# Altium footprint library heromap.PcbLib: 593 footprints (part 18 of 38)
Each footprint in its own frame and in the unit in brackets; x right, y up, seen from the top. Pads: shape width x height; smd on the part's side, far side on the other; paste and mask are expansions set on the pad; w line width, h text height; cw(c..) or ccw(c..) is an arc to the next point about the centre after c.
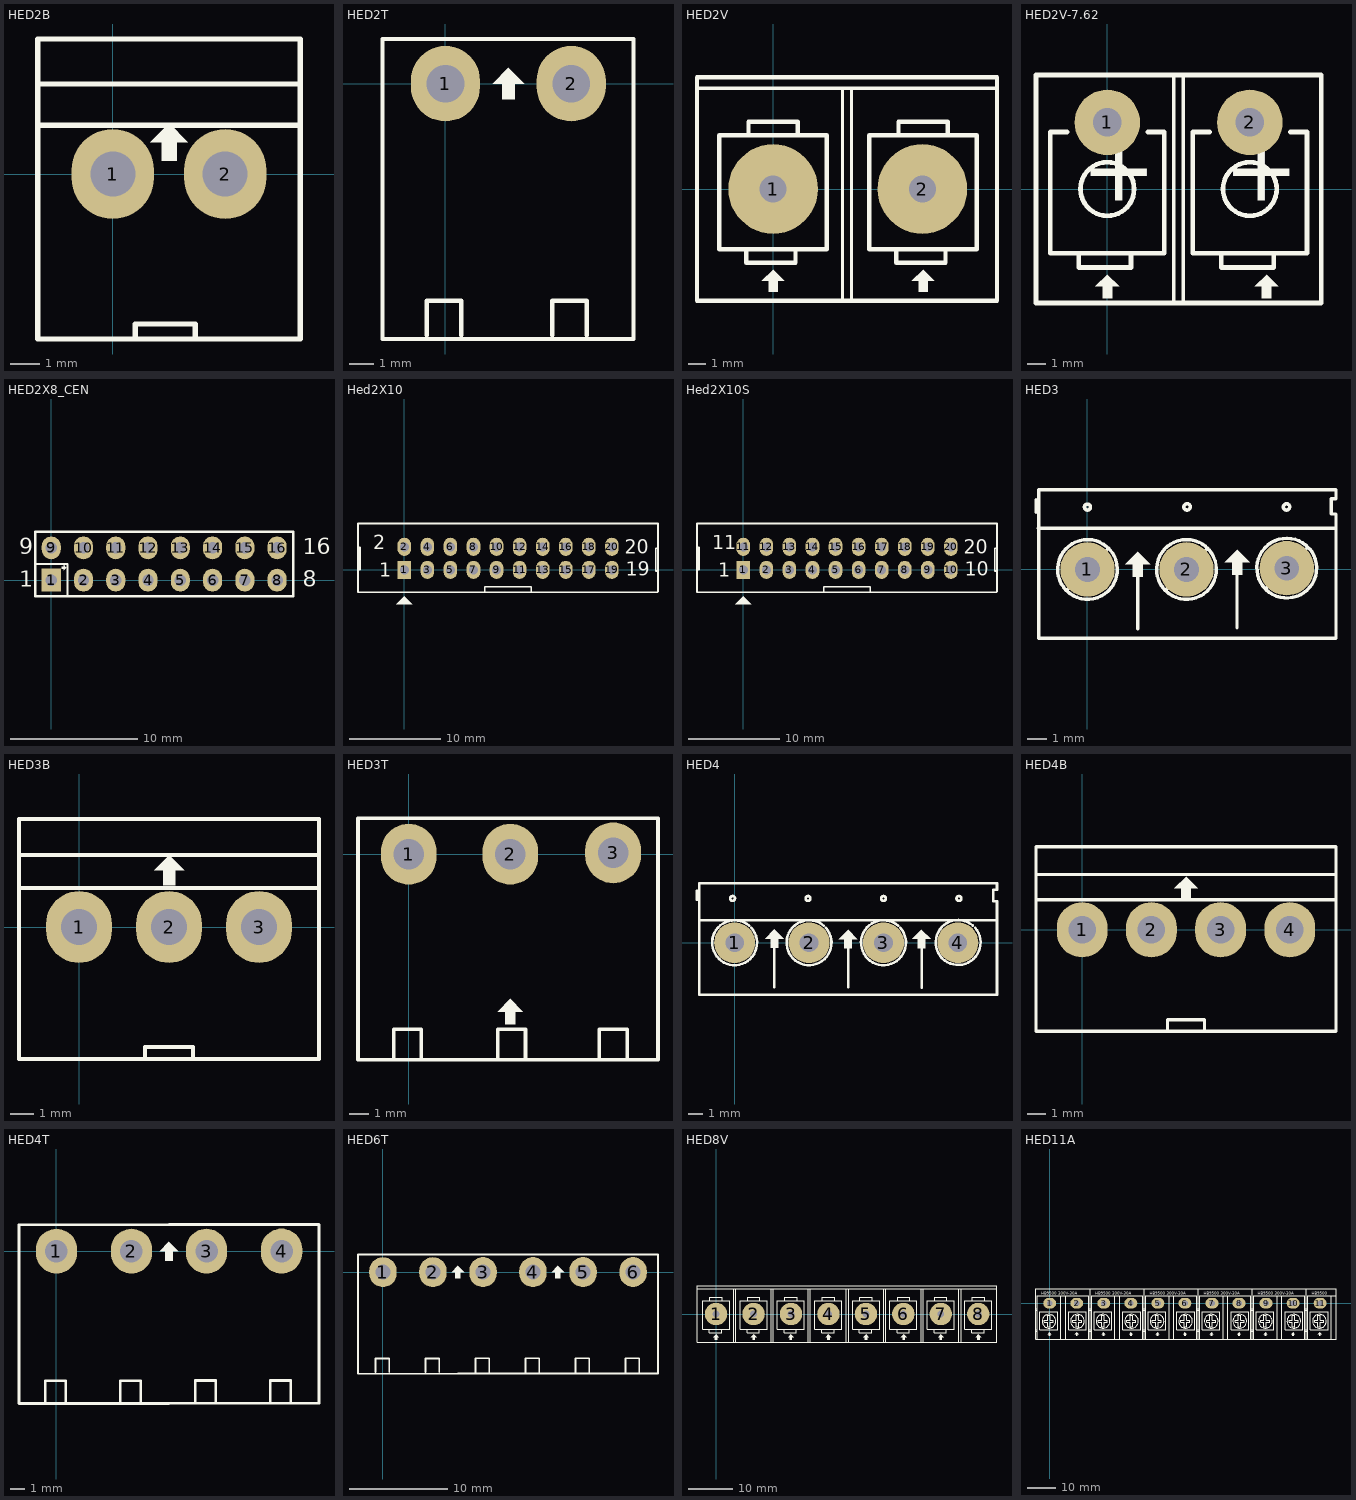
[diagram p17: the footprints below, top view; thin cyan lines are the x and y axes]

## HED2B [mil] "Header 2, 2 pin, hight 300mil, Pin to Pin 150, Colour White"
height 300
pads (2):
  oval 110x120 hole 60: 1(0,0) 2(150,0)
Top Overlay:
  region: 75,67.5 50,42.5 65,42.5 65,17.5 85,17.5 85,42.5 100,42.5
  lines w7: -100,65 250,65 ; -100,120 250,120 ; 30,-220 30,-200 110,-200 110,-220 ; -100,-220 -100,180 250,180 250,-220 -100,-220

## HED2T [mil] "Header 2, 2 pin, hight 300mil, Pin to Pin 200, Colour Green"
height 300
pads (2):
  oval 110x120 hole 60: 1(0,0) 2(200,0)
Top Overlay:
  region: 100,25 75,0 90,0 90,-25 110,-25 110,0 125,0
  lines w7: -30,-400 -30,-345 25,-345 25,-400 ; 170,-400 170,-345 225,-345 225,-400 ; -100,-406 299,-406 299,-15 299,15 299,71 -100,71 -100,-406
3D body "SW3dPS-5EHDR_2P.STEP": height 333.51, standoff -157.48, extent -100,-406.22 293.7,66.22

## HED2V [mil] "Header 6"
height 300
pads (2):
  round 200 hole 60: 1(0,0) 2(333.33,0)
Top Overlay:
  region: 335,-180 310,-205 325,-205 325,-230 345,-230 345,-205 360,-205
  region: 0,-180 -25,-205 -10,-205 -10,-230 10,-230 10,-205 25,-205
  lines w7: -170,225 499,225 ; 155,-250 155,225 ; 175,-250 175,225
  lines w10: -60,-135 -60,-165 50,-165 50,-135 ; -55,120 -55,150 55,150 55,120 ; 275,-135 275,-165 385,-165 385,-135 ; 280,120 280,150 390,150 390,120 ; -170,-250 -170,250 500,250 500,-250 -170,-250 ; -120,-135 120,-135 120,120 -120,120 -120,-135 ; 215,-135 215,120 455,120 455,-135 215,-135

## HED2V-7.62 [mm] "Header 6"
height 7.62
pads (2):
  round 3.5 hole 1.524: 1(0,3.556) 2(7.62,3.556)
Top Overlay:
  circle w0.254: c0,0 r1.433
  circle w0.254: c7.62,0 r1.433
  region: 0,-4.572 -0.635,-5.207 -0.254,-5.207 -0.254,-5.842 0.254,-5.842 0.254,-5.207 0.635,-5.207
  region: 8.509,-4.572 7.874,-5.207 8.255,-5.207 8.255,-5.842 8.763,-5.842 8.763,-5.207 9.144,-5.207
  lines w0.178: 3.556,-6.096 3.556,6.096 ; 4.064,-6.096 4.064,6.096
  lines w0.254: -3.81,3.556 -3.81,6.096 ; -2.159,3.048 -3.048,3.048 -3.048,-3.429 3.048,-3.429 3.048,3.048 2.159,3.048 ; -1.524,-3.429 -1.524,-4.191 1.27,-4.191 1.27,-3.429 ; 5.461,3.048 4.572,3.048 4.572,-3.429 10.668,-3.429 10.668,3.048 9.779,3.048 ; 6.096,-3.429 6.096,-4.191 8.89,-4.191 8.89,-3.429 ; -3.81,6.096 -3.81,0 -3.81,-6.096 11.43,-6.096 11.43,0 11.43,6.096 -3.81,6.096
  text "+" at -1.397,-1.778 h6
  text "+" at 6.223,-1.778 h6

## HED2X8_CEN [mm] "Connector; Header; 8x2 Position"
pads (16):
  rect 1.5x1.8 hole 0.9: 1(0,0)
  oval 1.5x1.8 hole 0.9: 2(2.54,0) 3(5.08,0) 4(7.62,0) 5(10.16,0) 6(12.7,0) 7(15.24,0) 8(17.78,0) 9(0,2.54) 10(2.54,2.54) 11(5.08,2.54) 12(7.62,2.54) 13(10.16,2.54) 14(12.7,2.54) 15(15.24,2.54) 16(17.78,2.54)
Top Overlay:
  region: 0.813,1.067 0.991,1.067 0.991,1.194 1.194,0.991 0.991,0.787 0.991,0.914 0.813,0.914
  lines w0.178: -1.27,1.27 1.27,1.27 1.27,-1.27
  lines w0.2: -1.27,-1.27 -1.27,3.81 19.05,3.81 19.05,-1.27 -1.27,-1.27
  text "9" at -2.54,2.032 h1.27
  text "1" at -2.54,-0.508 h1.27
  text "8" at 19.812,-0.508 h1.27
  text "16" at 19.812,2.032 h1.27

## Hed2X10 [mm] "Header 10x2,20 pin, connecter"
height 7.62
pads (20):
  rect 1.5x2 hole 1: 1(0,0)
  oval 1.5x2 hole 1: 2(0,2.54) 3(2.54,0) 4(2.54,2.54) 5(5.08,0) 6(5.08,2.54) 7(7.62,0) 8(7.62,2.54) 9(10.16,0) 10(10.16,2.54) 11(12.7,0) 12(12.7,2.54) 13(15.24,0) 14(15.24,2.54) 15(17.78,0) 16(17.78,2.54) 17(20.32,0) 18(20.32,2.54) 19(22.86,0) 20(22.86,2.54)
Top Overlay:
  region: 0,-2.921 -0.889,-3.81 0.889,-3.81
  lines w0.178: -5.1,-0.025 -5.075,0 -4.875,0 -4.875,2.475 -5.1,2.475 ; 8.875,-2.475 8.875,-1.875 13.975,-1.875 13.975,-2.425 14.025,-2.475 ; 27.94,-0.127 27.686,-0.127 27.686,2.398 27.94,2.398 ; 27.94,5.08 27.94,-2.413 27.878,-2.475 -5.1,-2.475 -5.1,5.1 27.94,5.1
  text "1" at -2.775,-0.75 h1.52
  text "2" at -3.429,2.286 h1.52
  text "19" at 24.384,-0.635 h1.52
  text "20" at 24.257,1.778 h1.52

## Hed2X10S [mm] "Header 10x2,20 pin, connecter"
height 7.62
pads (20):
  rect 1.5x2 hole 1: 1(0,0)
  oval 1.5x2 hole 1: 2(2.54,0) 3(5.08,0) 4(7.62,0) 5(10.16,0) 6(12.7,0) 7(15.24,0) 8(17.78,0) 9(20.32,0) 10(22.86,0) 11(0,2.54) 12(2.54,2.54) 13(5.08,2.54) 14(7.62,2.54) 15(10.16,2.54) 16(12.7,2.54) 17(15.24,2.54) 18(17.78,2.54) 19(20.32,2.54) 20(22.86,2.54)
Top Overlay:
  region: 0,-2.921 -0.889,-3.81 0.889,-3.81
  lines w0.178: -5.1,-0.025 -5.075,0 -4.875,0 -4.875,2.475 -5.1,2.475 ; 8.875,-2.475 8.875,-1.875 13.975,-1.875 13.975,-2.425 14.025,-2.475 ; 27.94,-0.127 27.686,-0.127 27.686,2.398 27.94,2.398 ; 27.94,5.08 27.94,-2.413 27.878,-2.475 -5.1,-2.475 -5.1,5.1 27.94,5.1
  text "20" at 24.257,1.778 h1.52
  text "10" at 24.384,-0.635 h1.52
  text "11" at -3.429,2.286 h1.52
  text "1" at -2.775,-0.75 h1.52

## HED3 [mil] "Header 3, 3 pin, hight 300mil, Pin to Pin 200, Colour Green"
height 300
pads (3):
  round 110 hole 50: 1(0,0) 2(200,0) 3(402.62,2.62)
Top Overlay:
  circle w7: c201.12,126.32 r6.4
  circle w7: c-0.08,126 r6.08
  circle w7: c402,126.32 r6.4
  region: 101.5,35.5 76.5,10.5 91.5,10.5 91.5,-14.5 111.5,-14.5 111.5,10.5 126.5,10.5
  region: 302.5,39.5 277.5,14.5 292.5,14.5 292.5,-10.5 312.5,-10.5 312.5,14.5 327.5,14.5
  lines w7: -104,116 -104,141 ; -99,83 501,83 ; -42,-42 43,43 ; 39.44,45.71 ccw(c0,0) 44.97,40.28 ; 102,-120 102,31 ; 158.5,-41.5 243,43 ; 238.89,46.18 ccw(c200,0) 245.38,39.82 ; 302,-118 302,33 ; 360,-39 445,45 ; 441.65,48.68 ccw(c402.62,2.62) 448.22,42.19 ; -98,-139 502,-139 502,112 492,112 492,143 502,143 502,161 -98,161 -98,11 -98,-139
3D body "SW3DPS-HDR1x3-MED-GREEN.STEP": height 393.7, standoff -157.48, extent -94,-138 496.55,157.28

## HED3B [mil] "Header 3, 3 pin, hight 300mil, Pin to Pin 150, Colour White"
height 300
pads (3):
  oval 110x120 hole 60: 1(0,0) 2(150,0) 3(300,0)
Top Overlay:
  region: 150,120 125,95 140,95 140,70 160,70 160,95 175,95
  lines w7: -100,65 400,65 ; -100,120 400,120 ; 110,-220 110,-200 190,-200 190,-220 ; -100,-220 -100,180 400,180 400,-220 -100,-220
3D body "User Library-1803280.STEP": height 285.43, standoff -133.86, extent -97.36,-310 407.36,56.14

## HED3T [mil] "Header 3, 3 pin, hight 300mil, Pin to Pin 200, Colour Green"
height 300
pads (3):
  oval 110x120 hole 60: 1(0,0) 2(200,0) 3(402.62,2.62)
Top Overlay:
  region: 200,-285 175,-310 190,-310 190,-335 210,-335 210,-310 225,-310
  lines w7: -30,-400 -30,-345 25,-345 25,-400 ; 175,-400 175,-345 230,-345 230,-400 ; 375,-400 375,-345 430,-345 430,-400 ; -100,-405 -100,71 491,71 491,15 491,7.5 491,-7.5 491,-15 491,-405 -100,-405
3D body "SW3dPS-5EHDR_2P.STEP": height 333.51, standoff -157.48, extent -100,-406.22 293.7,66.22
3D body "SW3dPS-5EHDR_2P.STEP": height 333.51, standoff -157.48, extent 96.85,-406.22 490.55,66.22

## HED4 [mil] "Header 4, 4 pin, hight 300mil, Pin to Pin 200, Colour Green"
height 300
pads (4):
  round 110 hole 50: 1(0,0) 2(200,0) 3(400,0) 4(600,0)
Top Overlay:
  circle w7: c602.6,119 r6.4
  circle w7: c399.93,119 r6.4
  circle w7: c-5.4,119 r6.4
  circle w7: c197.26,119 r6.4
  region: 305,34.5 280,9.5 295,9.5 295,-15.5 315,-15.5 315,9.5 330,9.5
  region: 107,36 82,11 97,11 97,-14 117,-14 117,11 132,11
  region: 502,35.5 477,10.5 492,10.5 492,-14.5 512,-14.5 512,10.5 527,10.5
  lines w7: -101,115 -101,140 ; -95,60 705,60 ; 39.04,46.05 ccw(c0,0) 45.18,40.05 ; 107,-119 107,32 ; 239.76,45.44 ccw(c200,0) 245.18,40.05 ; 305,-119 305,0 ; 439.27,45.97 ccw(c400.06,0.06) 445.19,40.17 ; 502.97,-121.03 502.97,29.97 ; 640.16,46.18 ccw(c600.59,0.59) 646.12,40.23 ; -95,-140 -95,10 -95,160 705,160 705,142 695,142 695,111 705,111 705,-140 -95,-140
3D body "SW3DPS-HDR1x4-MED-GREEN.STEP": height 393.7, standoff -157.48, extent -89.7,-138.28 697.7,157

## HED4B [mil] "Header 4, 4 pin, hight 300mil, Pin to Pin 150, Colour White"
height 300
pads (4):
  oval 110x120 hole 60: 1(0,0) 2(150,0) 3(300,0) 4(450,0)
Top Overlay:
  region: 225,115 200,90 215,90 215,65 235,65 235,90 250,90
  lines w7: -100,65 550,65 ; -100,120 550,120 ; 185,-215 185,-195 265,-195 265,-215 ; -100,-220 -100,180 550,180 550,-220 -100,-220

## HED4T [mil] "Header 4, 4 pin, hight 300mil, Pin to Pin 200, Colour Green"
height 300
pads (4):
  oval 110x120 hole 60: 1(0,0) 2(200,0) 3(400.06,0.06) 4(600.39,0.39)
Top Overlay:
  region: 300,25 275,0 290,0 290,-25 310,-25 310,0 325,0
  lines w7: -30,-400 -30,-345 25,-345 25,-400 ; 170,-400 170,-345 225,-345 225,-400 ; 295.06,-14.94 295.06,15.06 ; 300,-406 -100,-406 -100,71 300,71 ; 300.06,-405.94 700.06,-405.94 700.06,-14.94 700.06,15.06 700.06,71.06 300.06,71.06 ; 370.06,-399.94 370.06,-344.94 425.06,-344.94 425.06,-399.94 ; 570.06,-399.94 570.06,-344.94 625.06,-344.94 625.06,-399.94
3D body "SW3dPS-5EHDR_2P.STEP": height 333.51, standoff -157.48, extent 300.06,-406.16 693.76,66.28
3D body "SW3dPS-5EHDR_2P.STEP": height 333.51, standoff -157.48, extent -100,-406.22 293.7,66.22

## HED6T [mil] "Header 4, 4 pin, hight 300mil, Pin to Pin 200, Colour Green"
height 300
pads (6):
  oval 110x120 hole 60: 1(0,0) 2(200,0) 3(400.06,0.06) 4(600.06,0.06) 5(800.12,0.12) 6(1000.46,0.46)
Top Overlay:
  region: 700.06,25.06 675.06,0.06 690.06,0.06 690.06,-24.94 710.06,-24.94 710.06,0.06 725.06,0.06
  region: 300,25 275,0 290,0 290,-25 310,-25 310,0 325,0
  lines w7: -30,-400 -30,-345 25,-345 25,-400 ; 170,-400 170,-345 225,-345 225,-400 ; 295.06,-14.94 295.06,15.06 ; 300,-406 -100,-406 -100,71 300,71 ; 300.06,71.06 1100.12,71.06 ; 695.12,-14.88 695.12,15.12 ; 700.06,-14.94 700.06,15.06 ; 700.12,-405.88 1100.12,-405.88 1100.12,-14.88 1100.12,15.12 1100.12,71.12 ; 770.12,-399.88 770.12,-344.88 825.12,-344.88 825.12,-399.88 ; 970.12,-399.88 970.12,-344.88 1025.12,-344.88 1025.12,-399.88 ; 370.06,-344.94 370.06,-399.94 370.06,-344.94 ; 370.06,-344.94 425.06,-344.94 ; 370.06,-344.94 425.06,-344.94 ; 425.06,-344.94 425.06,-399.94 425.06,-344.94 ; 570.06,-344.94 570.06,-399.94 570.06,-344.94 ; 570.06,-344.94 625.06,-344.94 ; 570.06,-344.94 625.06,-344.94 ; 625.06,-344.94 625.06,-399.94 625.06,-344.94 ; 300.06,-405.94 700.06,-405.94 300.06,-405.94
3D body "SW3dPS-5EHDR_2P.STEP": height 333.51, standoff -157.48, extent 300.06,-406.16 693.76,66.28
3D body "SW3dPS-5EHDR_2P.STEP": height 333.51, standoff -157.48, extent 700.12,-406.1 1093.82,66.34
3D body "SW3dPS-5EHDR_2P.STEP": height 333.51, standoff -157.48, extent -100,-406.22 293.7,66.22

## HED8V [mil] "Header 6"
height 300
pads (8):
  round 200 hole 60: 1(0,0) 2(333.33,0) 3(666.67,0) 4(1000,0) 5(1333.33,0) 6(1666.67,0) 7(2000,0) 8(2333.33,0)
Top Overlay:
  drawing of 107 lines, arcs and shapes, not listed

## HED11A [mil] "Header 2: 300V-20A, 2 pin, hight 300mil, Pin to Pin 400, Colour Green"
height 300
pads (11):
  oval 180x150 hole 80: 1(0,0) 2(375,0) 3(750,0) 4(1125,0) 5(1500,0) 6(1875,0) 7(2250,0) 8(2625,0) 9(3000,0) 10(3375,0) 11(3750,0)
Top Overlay:
  drawing of 306 lines, arcs and shapes, not listed
  text "HB9500 300V-30A" at -115,115 h40
  text "HB9500 300V-30A" at 635,115 h40
  text "HB9500 300V-30A" at 1385,115 h40
  text "HB9500 300V-30A" at 2135,115 h40
  text "HB9500 300V-30A" at 2885,115 h40
  text "HB9500" at 3635,115 h40